# Altium footprint library 04.连接器件.pcb.PCBLIB: 363 footprints (part 5 of 23)
Each footprint in its own frame and in the unit in brackets; x right, y up, seen from the top. Pads: shape width x height; smd on the part's side, far side on the other; paste and mask are expansions set on the pad; w line width, h text height; cw(c..) or ccw(c..) is an arc to the next point about the centre after c.
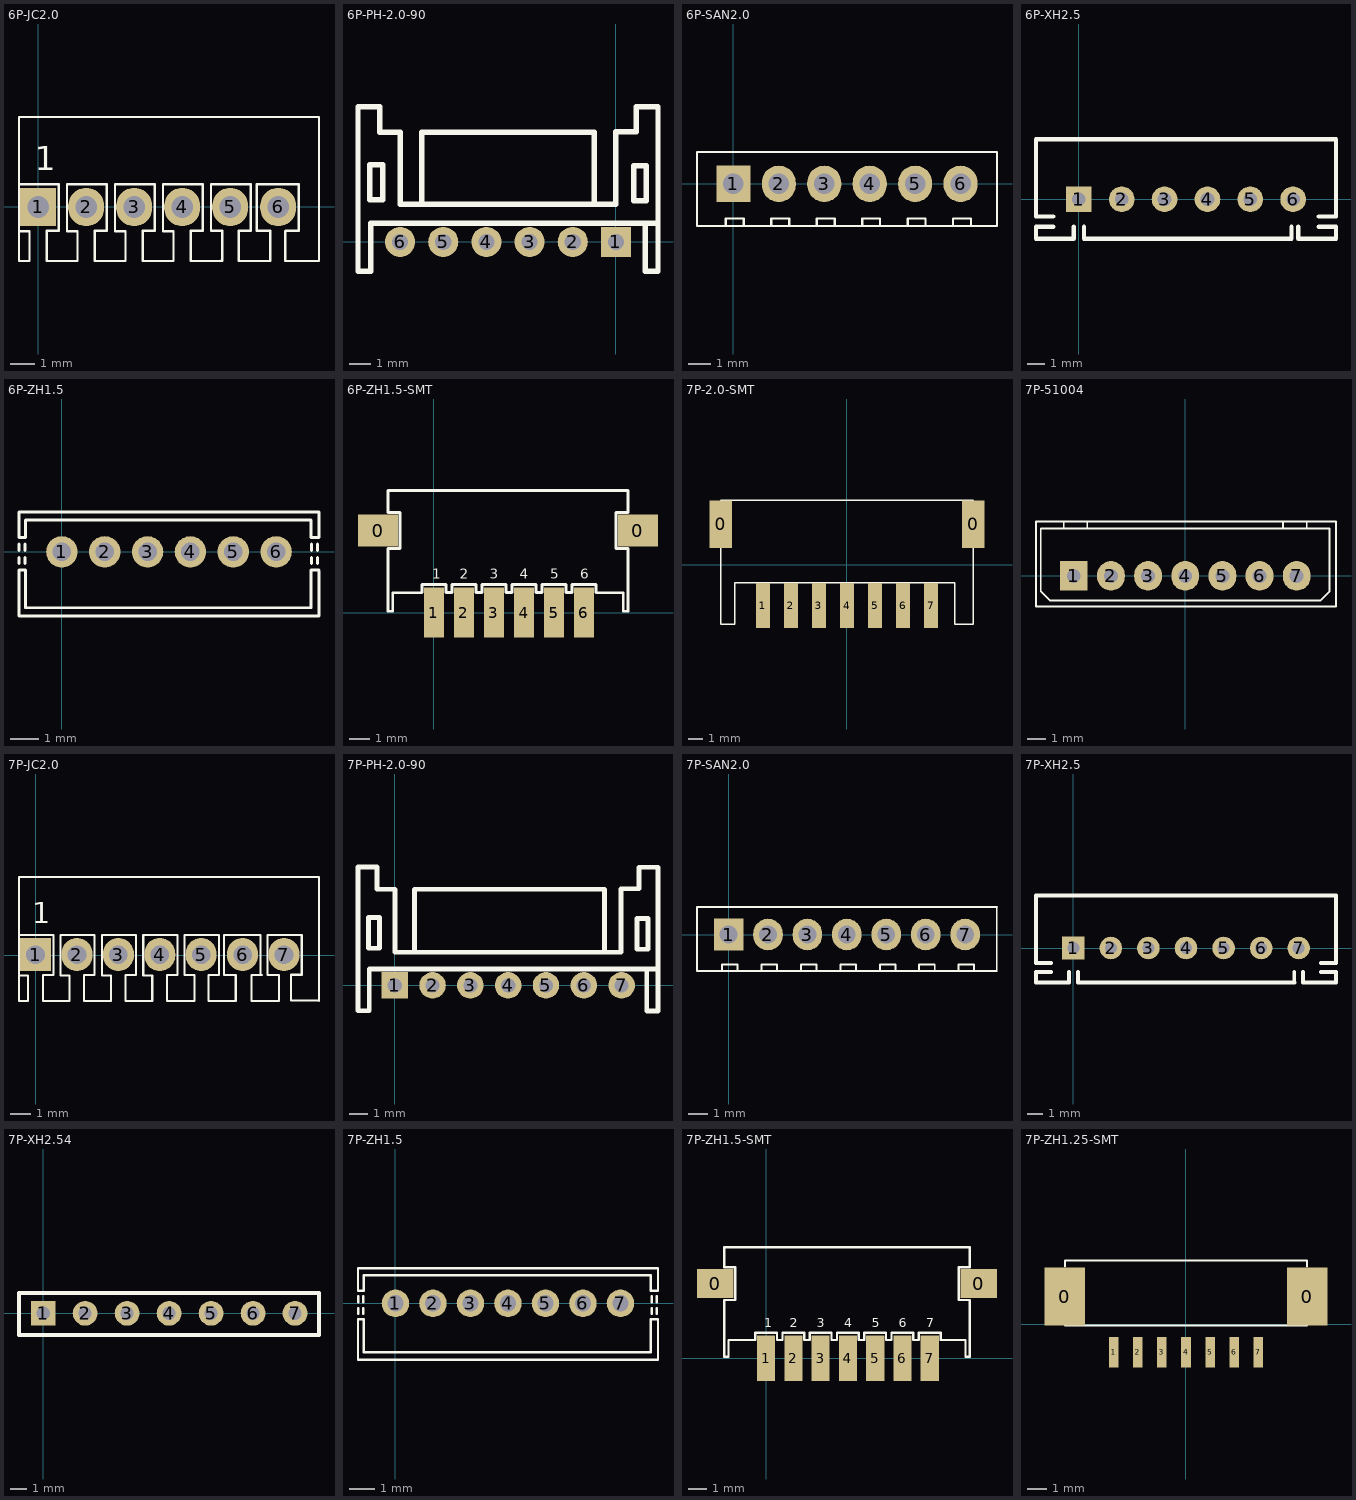
[diagram p4: the footprints below, top view; thin cyan lines are the x and y axes]

## 6P-JC2.0 [mm]
pads (6):
  rect 1.5x1.6 hole 0.9: 1(0,0)
  oval 1.5x1.6 hole 0.9: 2(2,0) 3(4,0) 4(6,0) 5(8,0) 6(10,0)
TopOverlay:
  lines w0.1: 1.623,-2.25 0.349,-2.25 0.349,-0.991 0.857,-0.991 0.857,0.94 -0.8,0.94 ; 1.638,-2.235 1.638,-1.016 1.2,-1.016 1.2,0.94 2.857,0.94 2.857,-0.991 2.349,-0.991 2.349,-2.25 3.2,-2.25 3.623,-2.25 3.638,-2.235 3.638,-1.016 3.2,-1.016 3.2,0.94 4.857,0.94 4.857,-0.991 4.349,-0.991 4.349,-2.25 5.623,-2.25 5.638,-2.235 5.638,-1.016 5.2,-1.016 5.2,0.94 6.857,0.94 6.857,-0.991 6.349,-0.991 6.349,-2.25 7.67,-2.25 7.67,-0.991 7.2,-0.991 7.2,0.94 8.857,0.94 8.857,-0.991 8.349,-0.991 8.349,-2.25 9.67,-2.25 9.67,-0.991 9.111,-0.991 9.111,0.94 10.864,0.94 10.864,-0.991 10.305,-0.991 ; 7.2,-2.25 7.623,-2.25 7.638,-2.235 ; 10.289,-1.005 10.289,-2.25 11.7,-2.25 11.7,3.75 -0.8,3.75 -0.8,0.94 ; -0.8,-1.016 -0.362,-1.016 -0.362,-2.235 -0.377,-2.25 -0.8,-2.25 -0.8,-1.016 ; -0.8,-1.016 -0.8,0.94
  text "1" at -0.152,1.524 h1
3D body "6P-JC2.0.STEP": height 3.4, standoff -3.22, extent -1.295,-7.163 11.205,3.837

## 6P-PH-2.0-90 [mm]
pads (6):
  rect 1.4x1.4 hole 0.75: 1(0,0)
  round 1.4 hole 0.75: 2(-2,0) 3(-4,0) 4(-6,0) 5(-8,0) 6(-10,0)
TopOverlay:
  lines w0.254: -9,1.754 -9,5.081 -1.123,5.081 ; -1,1.754 -1,5.081 ; 1.35,0.865 1.35,-1.35 1.95,-1.35 1.95,6.25 0.95,6.25 0.95,5.107 0,5.107 0,1.754 -10,1.754 -10,5.081 -10.94,5.081 -10.94,6.25 -11.95,6.25 -11.95,-1.35 -11.35,-1.35 -11.35,0.865 1.95,0.865 ; 1.377,0.865 1.827,0.865 ; -11.397,1.956 -10.813,1.956 -10.813,3.581 -11.397,3.581 -11.397,1.956 ; 0.832,1.906 0.832,3.532 1.417,3.532 1.417,1.906 0.832,1.906
3D body: height 5, standoff 0, extent -11.95,-1.35 1.95,6.25

## 6P-SAN2.0 [mm]
pads (6):
  rect 1.5x1.6 hole 0.9: 1(0,0)
  oval 1.5x1.6 hole 0.9: 2(2,0) 3(4,0) 4(6,0) 5(8,0) 6(10,0)
TopOverlay:
  lines w0.1: -1.6,-1.85 -1.6,1.4 11.582,1.4 ; -1.575,-1.854 11.601,-1.854 11.601,1.397 ; -0.33,-1.85 -0.33,-1.524 0.457,-1.524 0.457,-1.85 ; 1.67,-1.85 1.67,-1.524 2.457,-1.524 2.457,-1.85 ; 3.67,-1.85 3.67,-1.524 4.457,-1.524 4.457,-1.85 ; 5.67,-1.85 5.67,-1.524 6.457,-1.524 6.457,-1.85 ; 7.67,-1.85 7.67,-1.524 8.457,-1.524 8.457,-1.85 ; 9.67,-1.85 9.67,-1.524 10.457,-1.524 10.457,-1.85 ; 11.592,-1.85 11.6,-1.842
3D body "6P-SAN2.0.STEP": height 11, standoff -3.19, extent -1.6,-1.854 11.6,1.396

## 6P-XH2.5 [mm]
pads (6):
  rect 1.5x1.5 hole 0.8: 1(0,0)
  round 1.5 hole 0.8: 2(2.5,0) 3(5,0) 4(7.5,0) 5(10,0) 6(12.5,0)
TopOverlay:
  lines w0.254: -1.5,-1.6 -2.5,-1.6 -2.5,-2.3 -0.6,-2.3 ; -1.5,-1 -2.5,-1 -2.5,3.5 5,3.5 14.91,3.5 ; -0.9,-2.3 -0.3,-2.3 -0.3,-1.6 ; 0.3,-1.6 0.3,-2.3 0.6,-2.3 1.6,-2.3 11.7,-2.3 ; 11.4,-2.3 12.1,-2.3 ; 11.8,-2.3 12.4,-2.3 12.4,-1.6 ; 12.8,-1.6 12.8,-2.3 13.4,-2.3 ; 13.1,-2.3 15,-2.3 15,-1.6 14,-1.6 ; 14,-1 15,-1 15,3.5
3D body "6PIN-XH2.5.STEP": height 5.9, standoff -3.47, extent -2.489,-2.311 14.911,3.439

## 6P-ZH1.5 [mm]
pads (6):
  round 1.1 hole 0.65: 1(0,0) 2(1.5,0) 3(3,0) 4(4.5,0) 5(6,0) 6(7.5,0)
TopOverlay:
  lines w0.1: -1.499,-0.406 -1.499,-0.203 ; -1.499,0.051 -1.499,0.279 ; -1.295,-0.406 -1.295,-0.203 ; -1.295,0.051 -1.295,0.279 ; 8.742,-0.406 8.742,-0.203 ; 8.742,0.051 8.742,0.279 ; 8.945,-0.406 8.945,-0.203 ; 8.945,0.051 8.945,0.279 ; 9,-0.682 9,-2.25 -1.5,-2.25 -1.5,-0.635 -1.27,-0.635 -1.27,-1.956 8.716,-1.956 8.716,-0.635 9,-0.635 ; -1.5,0.508 -1.27,0.508 -1.27,1.118 8.716,1.118 8.716,0.508 9,0.508 9,1.391 8.991,1.4 -1.5,1.4 -1.5,0.508
3D body "6P-ZH1.5.STEP": height 4.6, standoff -2.45, extent -1.499,-2.261 9.001,1.389

## 6P-ZH1.5-SMT [mm]
pads (8):
  rect 2x1.6 smd: 0(-2.8,4.1) 0(10.2,4.1)
  rect 1x2.5 smd: 1(0,0) 2(1.5,0) 3(3,0) 4(4.5,0) 5(6,0) 6(7.5,0)
TopOverlay:
  lines w0.127: 6.61,0.99 6.6,1 ; 5.1,1 5.4,1 ; 5.1,1 5.1,1.4 ; 5.1,1 5.4,1 ; 5.1,1 5.1,1.4 ; 5.1,1.4 3.9,1.4 3.9,1 3.6,1 3.6,1.4 2.4,1.4 2.4,1 2.1,1 2.1,1.4 0.9,1.4 0.9,1 0.6,1 0.6,1.4 -0.6,1.4 -0.6,1 -0.61,0.99 -2.07,0.99 -2.07,0.07 -2.3,0.07 -2.3,3.2 -1.7,3.2 -1.7,5 -2.3,5 -2.3,6.1 9.7,6.1 9.7,5 9.1,5 9.1,3.2 9.7,3.2 9.7,0.07 9.47,0.07 9.47,0.99 8.11,0.99 8.1,1 8.1,1.4 6.9,1.4 6.9,1 6.6,1 ; 5.4,1 5.4,1.4 ; 5.4,1 5.4,1.4 ; 5.4,1.4 6.6,1.4 ; 5.4,1.4 6.6,1.4 ; 6.6,1 6.6,1.4 ; 6.6,1 6.6,1.4
  text "5" at 5.8,1.7 h0.5
  text "4" at 4.3,1.7 h0.5
  text "3" at 2.8,1.7 h0.5
  text "2" at 1.3,1.7 h0.5
  text "1" at -0.1,1.7 h0.5
  text "6" at 7.3,1.7 h0.5
3D body "6P-ZH1.5-SMT.STEP": height 3.7, standoff -0.25, extent -2.286,-0.381 9.714,6.119

## 7P-2.0-SMT [mm]
pads (9):
  rect 1.6x3.4 smd: 0(-9,2.9) 0(9,2.9)
  rect 1x3.2 smd: 1(-6,-2.9) 2(-4,-2.9) 3(-2,-2.9) 4(0,-2.9) 5(2,-2.9) 6(4,-2.9) 7(6,-2.9)
TopOverlay:
  lines w0.1: -7.93,4.628 9.01,4.628 9.01,-4.25 7.701,-4.25 7.701,-1.265 -5.25,-1.265 ; -5.219,-1.265 -8,-1.265 -8,-4.25 -9,-4.25 -9,4.628 -2.07,4.628
3D body: height 3.2, standoff 0, extent 8.271,-3.193 9.021,-0.93
3D body: height 3.2, standoff 0, extent -9,-3.238 -8.3,-0.975
3D body: height 0.3, standoff 0, extent -4.5,-3.713 -3.5,-0.55
3D body: height 0.3, standoff 0, extent -6.5,-3.713 -5.5,-0.55
3D body: height 5.6, standoff 0, extent -9,-1.275 9.01,4.628
3D body: height 0.3, standoff 0, extent -2.378,-3.713 -1.378,-0.55
3D body: height 0.3, standoff 0, extent -0.504,-3.703 0.496,-0.54
3D body: height 0.3, standoff 0, extent 1.497,-3.692 2.497,-0.529
3D body: height 0.3, standoff 0, extent 3.498,-3.671 4.498,-0.508
3D body: height 0.3, standoff 0, extent 5.499,-3.649 6.499,-0.487

## 7P-51004 [mm]
pads (7):
  rect 1.5x1.6 hole 0.75: 1(-6,0)
  oval 1.5x1.6 hole 0.75: 2(-4,0) 3(-2,0) 4(0,0) 5(2,0) 6(4,0) 7(6,0)
TopOverlay:
  lines w0.1: -6.54,2.54 -6.54,2.921 ; -5.27,2.54 -5.27,2.921 ; 5.27,2.54 5.27,2.921 ; 6.54,2.54 6.54,2.921 ; -8.032,-1.651 8.115,-1.651 8.115,2.921 -8.032,2.921 -8.032,-1.651 ; -7.774,-0.833 -7.774,2.54 0.226,2.54 7.774,2.54 7.774,-0.833 7.282,-1.325 3,-1.325 -7.282,-1.325 -7.774,-0.833
3D body "510004-7.STEP": height 5.9, standoff -3.47, extent -7.949,-1.555 8.051,2.845

## 7P-JC2.0 [mm]
pads (7):
  rect 1.5x1.6 hole 0.9: 1(0,0.025)
  oval 1.5x1.6 hole 0.9: 2(2,0.025) 3(4,0.025) 4(6,0.025) 5(8,0.025) 6(10,0.025) 7(12,0.025)
TopOverlay:
  lines w0.1: 1.623,-2.225 0.349,-2.225 0.349,-0.965 0.857,-0.965 0.857,0.965 -0.8,0.965 ; 1.638,-2.21 1.638,-0.991 1.2,-0.991 1.2,0.965 2.857,0.965 2.857,-0.965 2.349,-0.965 2.349,-2.225 3.2,-2.225 3.623,-2.225 3.638,-2.21 3.638,-0.991 3.2,-0.991 3.2,0.965 4.857,0.965 4.857,-0.965 4.349,-0.965 4.349,-2.225 5.623,-2.225 5.638,-2.21 5.638,-0.991 5.2,-0.991 5.2,0.965 6.857,0.965 6.857,-0.965 6.349,-0.965 6.349,-2.225 7.67,-2.225 7.67,-0.965 7.2,-0.965 7.2,0.965 8.857,0.965 8.857,-0.965 8.349,-0.965 8.349,-2.225 9.67,-2.225 9.67,-0.965 9.111,-0.965 9.111,0.965 10.864,0.965 10.864,-0.965 ; 7.2,-2.225 7.623,-2.225 7.638,-2.21 ; 10.94,-0.965 10.432,-0.965 10.432,-2.225 11.753,-2.225 11.753,-0.965 11.194,-0.965 ; 11.2,-0.965 11.2,0.965 12.857,0.965 12.857,-0.965 12.349,-0.965 ; 12.845,-0.94 12.337,-0.94 12.337,-2.199 13.658,-2.199 ; 13.688,-2.225 13.688,3.775 ; 13.691,3.783 -0.8,3.775 -0.8,0.965 ; -0.8,-0.991 -0.362,-0.991 -0.362,-2.21 -0.377,-2.225 -0.8,-2.225 -0.8,-0.991 ; -0.8,-0.991 -0.8,0.965
  text "1" at -0.152,1.549 h1
3D body "7P-JC2.0.STEP": height 3.4, standoff -3.22, extent -1.245,-7.188 13.255,3.812

## 7P-PH-2.0-90 [mm]
pads (7):
  rect 1.4x1.4 hole 0.75: 1(0,0)
  round 1.4 hole 0.75: 2(2,0) 3(4,0) 4(6,0) 5(8,0) 6(10,0) 7(12,0)
TopOverlay:
  lines w0.254: -1.348,0.865 2.65,0.865 13.455,0.865 ; -1.342,0.868 -1.342,-1.346 -1.942,-1.346 -1.942,6.254 -0.932,6.254 -0.932,5.085 0.008,5.085 0.008,1.757 ; 0.012,1.754 4,1.754 11.974,1.754 11.974,5.107 12.924,5.107 12.924,6.25 13.924,6.25 13.924,-1.35 13.324,-1.35 13.324,0.865 ; 1.047,1.754 1.047,5.081 11.097,5.081 11.097,1.754 ; 13.35,0.865 13.8,0.865 ; -1.389,1.959 -1.389,3.585 -0.805,3.585 -0.805,1.959 -1.389,1.959 ; 12.806,1.906 12.806,3.532 13.39,3.532 13.39,1.906 12.806,1.906
3D body: height 5, standoff 0, extent -1.93,-1.301 13.983,6.25

## 7P-SAN2.0 [mm]
pads (7):
  rect 1.5x1.6 hole 0.9: 1(0,0)
  oval 1.5x1.6 hole 0.9: 2(2,0) 3(4,0) 4(6,0) 5(8,0) 6(10,0) 7(12,0)
TopOverlay:
  lines w0.1: -1.6,-1.85 -1.6,1.4 13.614,1.4 ; -1.575,-1.854 13.589,-1.854 ; -0.33,-1.85 -0.33,-1.524 0.457,-1.524 0.457,-1.85 ; 1.67,-1.85 1.67,-1.524 2.457,-1.524 2.457,-1.85 ; 3.67,-1.85 3.67,-1.524 4.457,-1.524 4.457,-1.85 ; 5.67,-1.85 5.67,-1.524 6.457,-1.524 6.457,-1.85 ; 7.67,-1.85 7.67,-1.524 8.457,-1.524 8.457,-1.85 ; 9.67,-1.85 9.67,-1.524 10.457,-1.524 10.457,-1.85 ; 11.67,-1.85 11.67,-1.524 12.457,-1.524 12.457,-1.85 ; 13.592,-1.85 13.6,-1.842 ; 13.601,-1.854 13.601,1.397
3D body "7P-SAN2.0.STEP": height 11, standoff -3.19, extent -1.6,-1.88 13.6,1.37

## 7P-XH2.5 [mm]
pads (7):
  rect 1.5x1.5 hole 0.8: 1(0,0)
  round 1.5 hole 0.8: 2(2.5,0) 3(5,0) 4(7.5,0) 5(10,0) 6(12.5,0) 7(15,0)
TopOverlay:
  lines w0.254: -1.48,-1.6 -2.48,-1.6 -2.48,-2.3 -0.58,-2.3 ; -1.48,-1 -2.48,-1 -2.48,3.5 5.02,3.5 17.424,3.5 ; -0.88,-2.3 -0.28,-2.3 -0.28,-1.6 ; 0.32,-1.6 0.32,-2.3 0.62,-2.3 1.62,-2.3 14.22,-2.3 ; 13.92,-2.3 14.72,-2.3 ; 14.42,-2.3 14.707,-2.3 14.707,-1.6 ; 15.28,-1.6 15.28,-2.3 15.88,-2.3 ; 15.58,-2.3 17.48,-2.3 17.48,-1.6 16.48,-1.6 ; 16.48,-1 17.48,-1 17.48,3.5
3D body "7PIN-XH2.5.STEP": height 5.9, standoff -3.47, extent -2.489,-2.388 17.411,3.362

## 7P-XH2.54 [mm]
pads (7):
  rect 1.5x1.5 hole 0.8: 1(0,0)
  round 1.5 hole 0.8: 2(2.54,0) 3(5.08,0) 4(7.62,0) 5(10.16,0) 6(12.7,0) 7(15.24,0)
TopOverlay:
  lines w0.254: -1.462,-1.315 16.69,-1.315 16.69,1.23 2.75,1.23 -1.462,1.23 -1.462,-1.315

## 7P-ZH1.5 [mm]
pads (7):
  round 1.1 hole 0.65: 1(0,0) 2(1.5,0) 3(3,0) 4(4.5,0) 5(6,0) 6(7.5,0) 7(9,0)
TopOverlay:
  lines w0.1: -1.499,-0.406 -1.499,-0.203 ; -1.499,0.051 -1.499,0.279 ; -1.295,-0.406 -1.295,-0.203 ; -1.295,0.051 -1.295,0.279 ; 10.242,-0.406 10.242,-0.203 ; 10.242,0.051 10.242,0.279 ; 10.445,-0.406 10.445,-0.203 ; 10.445,0.051 10.445,0.279 ; 10.491,1.4 10.5,1.391 10.5,0.508 10.216,0.508 10.216,1.118 -1.27,1.118 -1.27,0.508 -1.5,0.508 -1.5,1.4 10.5,1.4 ; 10.5,-0.682 10.5,-2.25 -1.5,-2.25 -1.5,-0.635 -1.27,-0.635 -1.27,-1.956 10.216,-1.956 10.216,-0.635 10.5,-0.635
3D body "7P-ZH1.5.STEP": height 4.6, standoff -2.45, extent -1.499,-2.261 10.501,1.389

## 7P-ZH1.5-SMT [mm]
pads (9):
  rect 2x1.6 smd: 0(-2.8,4.1) 0(11.7,4.1)
  rect 1x2.5 smd: 1(0,0) 2(1.5,0) 3(3,0) 4(4.5,0) 5(6,0) 6(7.5,0) 7(9,0)
TopOverlay:
  lines w0.127: -2.3,0.07 -2.3,3.2 -1.7,3.2 -1.7,5 -2.3,5 -2.3,6.1 11.2,6.1 11.2,5 10.6,5 10.6,3.2 11.2,3.2 11.2,0.07 10.97,0.07 10.97,0.99 9.61,0.99 9.6,1 9.6,1.4 8.4,1.4 8.4,1 8.1,1 8.1,1.4 6.9,1.4 6.9,1 6.6,1 6.6,1.4 5.4,1.4 5.4,1 5.1,1 5.1,1.4 3.9,1.4 3.9,1 3.6,1 3.6,1.4 2.4,1.4 2.4,1 2.1,1 2.1,1.4 0.9,1.4 0.9,1 0.6,1 0.6,1.4 -0.6,1.4 -0.6,1 -0.61,0.99 -2.07,0.99 -2.07,0.07 -2.3,0.07
  text "6" at 7.3,1.7 h0.5
  text "7" at 8.8,1.7 h0.5
  text "1" at -0.1,1.7 h0.5
  text "2" at 1.3,1.7 h0.5
  text "3" at 2.8,1.7 h0.5
  text "4" at 4.3,1.7 h0.5
  text "5" at 5.8,1.7 h0.5
3D body "7P-ZH1.5-SMT.STEP": height 3.7, standoff -0.25, extent -2.286,-0.432 11.214,6.068

## 7P-ZH1.25-SMT [mm]
pads (9):
  rect 2.1x3 smd: 0(-6.29,1.448) 0(6.29,1.448)
  rect 0.5x1.6 smd: 1(-3.75,-1.448) 2(-2.5,-1.448) 3(-1.25,-1.448) 4(0,-1.448) 5(1.25,-1.448) 6(2.5,-1.448) 7(3.75,-1.448)
TopOverlay:
  lines w0.1: -6.29,-0.048 -3.75,-0.048 1.5,-0.048 6.29,-0.048 ; -6.29,2.999 -6.29,3.326 1.482,3.326 6.29,3.327 6.29,2.999
3D body: height 3.7, standoff 0, extent -6.29,-0.051 6.29,3.327
3D body: height 0.3, standoff 0, extent -4.131,-2.337 -3.369,-0.559
3D body: height 0.3, standoff 0, extent -2.861,-2.337 -2.099,-0.559
3D body: height 0.3, standoff 0, extent -1.591,-2.337 -0.829,-0.559
3D body: height 0.3, standoff 0, extent -0.448,-2.337 0.314,-0.559
3D body: height 0.3, standoff 0, extent 0.822,-2.337 1.584,-0.559
3D body: height 0.3, standoff 0, extent 2.092,-2.337 2.854,-0.559
3D body: height 0.3, standoff 0, extent 3.362,-2.337 4.124,-0.559